# Altium footprint library SparkFun-Retired.PCBLIB: 302 footprints (part 18 of 19)
Each footprint in its own frame and in the unit in brackets; x right, y up, seen from the top. Pads: shape width x height; smd on the part's side, far side on the other; paste and mask are expansions set on the pad; w line width, h text height; cw(c..) or ccw(c..) is an arc to the next point about the centre after c.
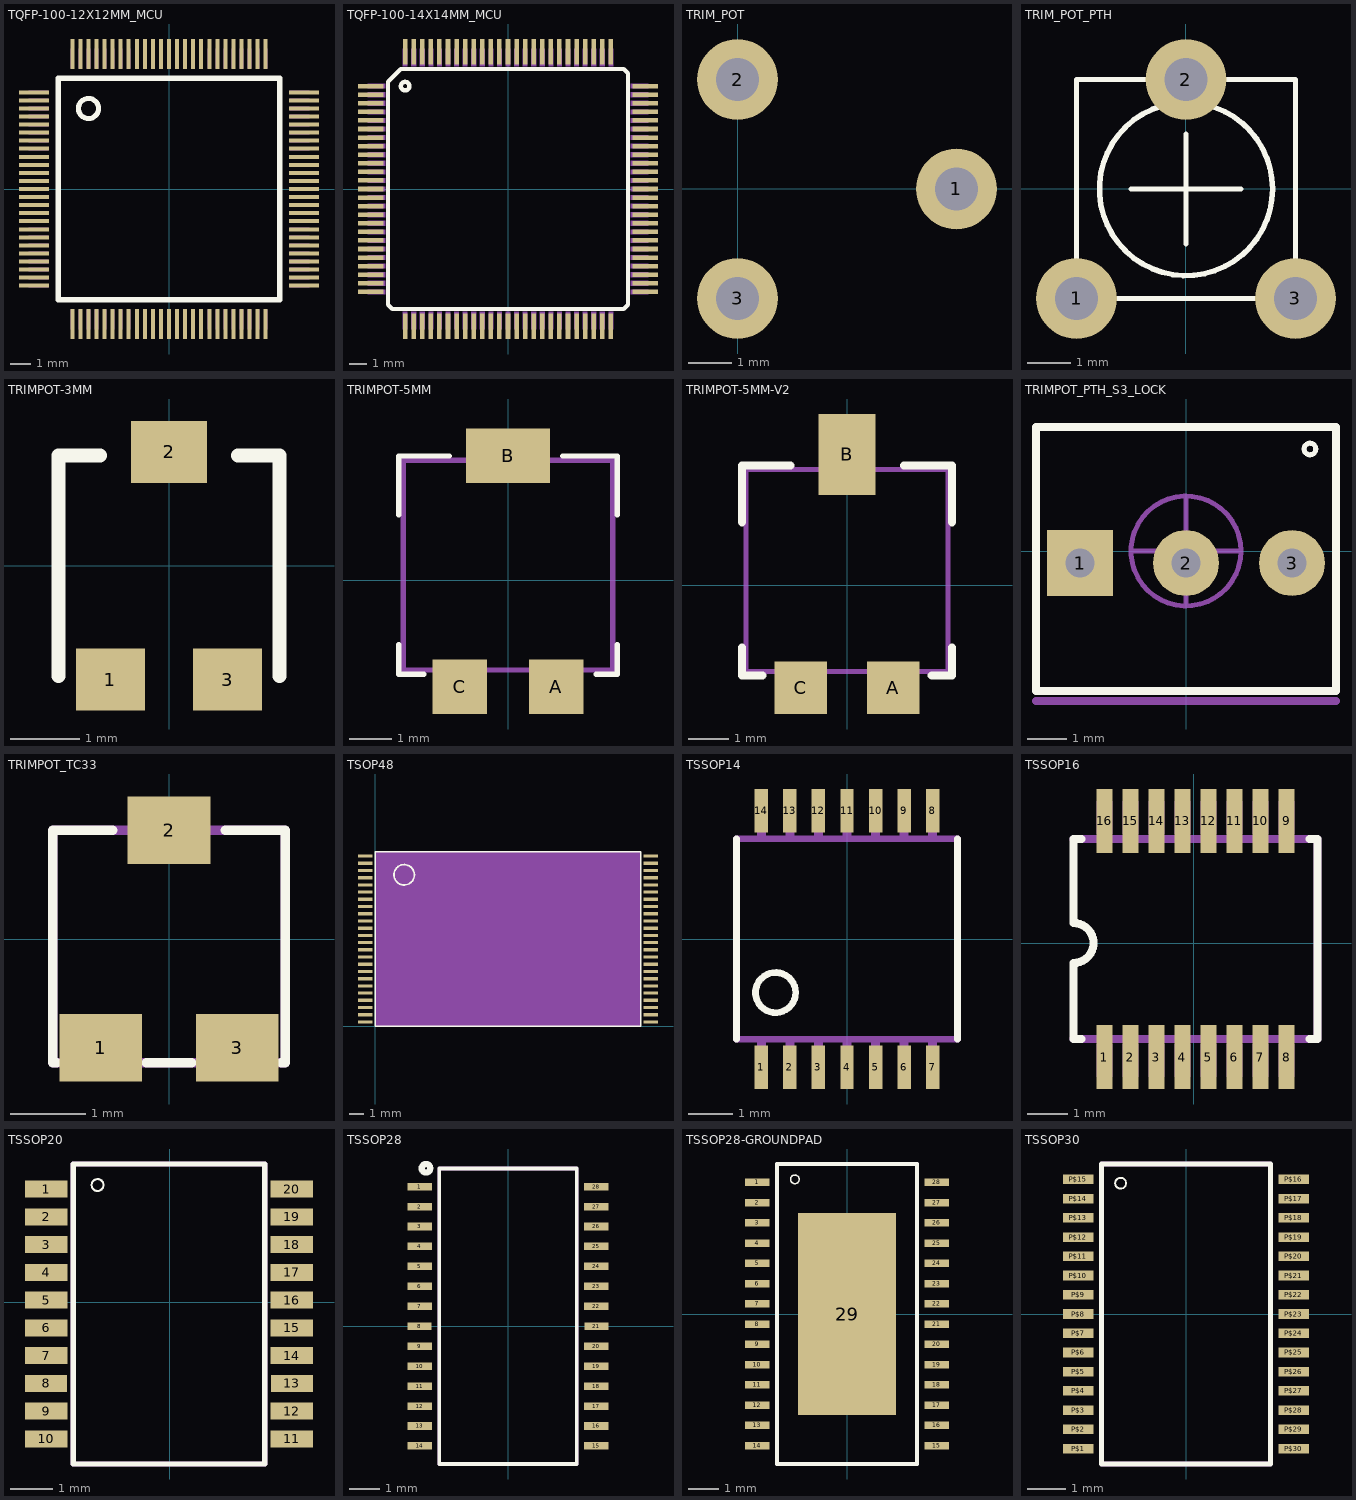
[diagram p17: the footprints below, top view; thin cyan lines are the x and y axes]

## TQFP-100-12X12MM_MCU [mm]
pads (100):
  rect 1.5x0.2 smd: 1(-6.7,4.8) 2(-6.7,4.4) 3(-6.7,4) 4(-6.7,3.6) 5(-6.7,3.2) 6(-6.7,2.8) 7(-6.7,2.4) 8(-6.7,2) 9(-6.7,1.6) 10(-6.7,1.2) 11(-6.7,0.8) 12(-6.7,0.4) 13(-6.7,0) 14(-6.7,-0.4) 15(-6.7,-0.8) 16(-6.7,-1.2) 17(-6.7,-1.6) 18(-6.7,-2) 19(-6.7,-2.4) 20(-6.7,-2.8) 21(-6.7,-3.2) 22(-6.7,-3.6) 23(-6.7,-4) 24(-6.7,-4.4) 25(-6.7,-4.8) 51(6.7,-4.8) 52(6.7,-4.4) 53(6.7,-4) 54(6.7,-3.6) 55(6.7,-3.2) 56(6.7,-2.8) 57(6.7,-2.4) 58(6.7,-2) 59(6.7,-1.6) 60(6.7,-1.2) 61(6.7,-0.8) 62(6.7,-0.4) 63(6.7,0) 64(6.7,0.4) 65(6.7,0.8) 66(6.7,1.2) 67(6.7,1.6) 68(6.7,2) 69(6.7,2.4) 70(6.7,2.8) 71(6.7,3.2) 72(6.7,3.6) 73(6.7,4) 74(6.7,4.4) 75(6.7,4.8)
  rect 0.2x1.5 smd: 26(-4.8,-6.7) 27(-4.4,-6.7) 28(-4,-6.7) 29(-3.6,-6.7) 30(-3.2,-6.7) 31(-2.8,-6.7) 32(-2.4,-6.7) 33(-2,-6.7) 34(-1.6,-6.7) 35(-1.2,-6.7) 36(-0.8,-6.7) 37(-0.4,-6.7) 38(0,-6.7) 39(0.4,-6.7) 40(0.8,-6.7) 41(1.2,-6.7) 42(1.6,-6.7) 43(2,-6.7) 44(2.4,-6.7) 45(2.8,-6.7) 46(3.2,-6.7) 47(3.6,-6.7) 48(4,-6.7) 49(4.4,-6.7) 50(4.8,-6.7) 76(4.8,6.7) 77(4.4,6.7) 78(4,6.7) 79(3.6,6.7) 80(3.2,6.7) 81(2.8,6.7) 82(2.4,6.7) 83(2,6.7) 84(1.6,6.7) 85(1.2,6.7) 86(0.8,6.7) 87(0.4,6.7) 88(0,6.7) 89(-0.4,6.7) 90(-0.8,6.7) 91(-1.2,6.7) 92(-1.6,6.7) 93(-2,6.7) 94(-2.4,6.7) 95(-2.8,6.7) 96(-3.2,6.7) 97(-3.6,6.7) 98(-4,6.7) 99(-4.4,6.7) 100(-4.8,6.7)
Top Overlay:
  circle w0.254: c-4,4 r0.5
  lines w0.254: -5.5,-5.5 -5.5,5.5 5.5,5.5 5.5,-5.5 -5.5,-5.5
Mechanical 16:
  region: -5.99,4.71 -5.99,4.89 -6.99,4.89 -6.99,4.71
  region: -5.99,4.31 -5.99,4.49 -6.99,4.49 -6.99,4.31
  region: -5.99,3.91 -5.99,4.09 -6.99,4.09 -6.99,3.91
  region: -5.99,3.51 -5.99,3.69 -6.99,3.69 -6.99,3.51
  region: -5.99,3.11 -5.99,3.29 -6.99,3.29 -6.99,3.11
  region: -5.99,2.71 -5.99,2.89 -6.99,2.89 -6.99,2.71
  region: -5.99,2.31 -5.99,2.49 -6.99,2.49 -6.99,2.31
  region: -5.99,1.91 -5.99,2.09 -6.99,2.09 -6.99,1.91
  region: -5.99,1.51 -5.99,1.69 -6.99,1.69 -6.99,1.51
  region: -5.99,1.11 -5.99,1.29 -6.99,1.29 -6.99,1.11
  region: -5.99,0.71 -5.99,0.89 -6.99,0.89 -6.99,0.71
  region: -5.99,0.31 -5.99,0.49 -6.99,0.49 -6.99,0.31
  region: -5.99,-0.09 -5.99,0.09 -6.99,0.09 -6.99,-0.09
  region: -5.99,-0.49 -5.99,-0.31 -6.99,-0.31 -6.99,-0.49
  region: -5.99,-0.89 -5.99,-0.71 -6.99,-0.71 -6.99,-0.89
  region: -5.99,-1.29 -5.99,-1.11 -6.99,-1.11 -6.99,-1.29
  region: -5.99,-1.69 -5.99,-1.51 -6.99,-1.51 -6.99,-1.69
  region: -5.99,-2.09 -5.99,-1.91 -6.99,-1.91 -6.99,-2.09
  region: -5.99,-2.49 -5.99,-2.31 -6.99,-2.31 -6.99,-2.49
  region: -5.99,-2.89 -5.99,-2.71 -6.99,-2.71 -6.99,-2.89
  region: -5.99,-3.29 -5.99,-3.11 -6.99,-3.11 -6.99,-3.29
  region: -5.99,-3.69 -5.99,-3.51 -6.99,-3.51 -6.99,-3.69
  region: -5.99,-4.09 -5.99,-3.91 -6.99,-3.91 -6.99,-4.09
  region: -5.99,-4.49 -5.99,-4.31 -6.99,-4.31 -6.99,-4.49
  region: -5.99,-4.89 -5.99,-4.71 -6.99,-4.71 -6.99,-4.89
  region: -4.71,-5.99 -4.89,-5.99 -4.89,-6.99 -4.71,-6.99
  region: -4.31,-5.99 -4.49,-5.99 -4.49,-6.99 -4.31,-6.99
  region: -3.91,-5.99 -4.09,-5.99 -4.09,-6.99 -3.91,-6.99
  region: -3.51,-5.99 -3.69,-5.99 -3.69,-6.99 -3.51,-6.99
  region: -3.11,-5.99 -3.29,-5.99 -3.29,-6.99 -3.11,-6.99
  region: -2.71,-5.99 -2.89,-5.99 -2.89,-6.99 -2.71,-6.99
  region: -2.31,-5.99 -2.49,-5.99 -2.49,-6.99 -2.31,-6.99
  region: -1.91,-5.99 -2.09,-5.99 -2.09,-6.99 -1.91,-6.99
  region: -1.51,-5.99 -1.69,-5.99 -1.69,-6.99 -1.51,-6.99
  region: -1.11,-5.99 -1.29,-5.99 -1.29,-6.99 -1.11,-6.99
  region: -0.71,-5.99 -0.89,-5.99 -0.89,-6.99 -0.71,-6.99
  region: -0.31,-5.99 -0.49,-5.99 -0.49,-6.99 -0.31,-6.99
  region: 0.09,-5.99 -0.09,-5.99 -0.09,-6.99 0.09,-6.99
  region: 0.49,-5.99 0.31,-5.99 0.31,-6.99 0.49,-6.99
  region: 0.89,-5.99 0.71,-5.99 0.71,-6.99 0.89,-6.99
  region: 1.29,-5.99 1.11,-5.99 1.11,-6.99 1.29,-6.99
  region: 1.69,-5.99 1.51,-5.99 1.51,-6.99 1.69,-6.99
  region: 2.09,-5.99 1.91,-5.99 1.91,-6.99 2.09,-6.99
  region: 2.49,-5.99 2.31,-5.99 2.31,-6.99 2.49,-6.99
  region: 2.89,-5.99 2.71,-5.99 2.71,-6.99 2.89,-6.99
  region: 3.29,-5.99 3.11,-5.99 3.11,-6.99 3.29,-6.99
  region: 3.69,-5.99 3.51,-5.99 3.51,-6.99 3.69,-6.99
  region: 4.09,-5.99 3.91,-5.99 3.91,-6.99 4.09,-6.99
  region: 4.09,-5.99 3.91,-5.99 3.91,-6.99 4.09,-6.99
  region: 4.49,-5.99 4.31,-5.99 4.31,-6.99 4.49,-6.99
  region: 4.89,-5.99 4.71,-5.99 4.71,-6.99 4.89,-6.99
  region: 5.99,-4.71 5.99,-4.89 6.99,-4.89 6.99,-4.71
  region: 5.99,-4.31 5.99,-4.49 6.99,-4.49 6.99,-4.31
  region: 5.99,-3.91 5.99,-4.09 6.99,-4.09 6.99,-3.91
  region: 5.99,-3.91 5.99,-4.09 6.99,-4.09 6.99,-3.91
  region: 5.99,-3.51 5.99,-3.69 6.99,-3.69 6.99,-3.51
  region: 5.99,-3.51 5.99,-3.69 6.99,-3.69 6.99,-3.51
  region: 5.99,-3.11 5.99,-3.29 6.99,-3.29 6.99,-3.11
  region: 5.99,-2.71 5.99,-2.89 6.99,-2.89 6.99,-2.71
  region: 5.99,-2.31 5.99,-2.49 6.99,-2.49 6.99,-2.31
  region: 5.99,-1.91 5.99,-2.09 6.99,-2.09 6.99,-1.91
  region: 5.99,-1.51 5.99,-1.69 6.99,-1.69 6.99,-1.51
  region: 5.99,-1.11 5.99,-1.29 6.99,-1.29 6.99,-1.11
  region: 5.99,-0.71 5.99,-0.89 6.99,-0.89 6.99,-0.71
  region: 5.99,-0.31 5.99,-0.49 6.99,-0.49 6.99,-0.31
  region: 5.99,0.09 5.99,-0.09 6.99,-0.09 6.99,0.09
  region: 5.99,0.49 5.99,0.31 6.99,0.31 6.99,0.49
  region: 5.99,0.89 5.99,0.71 6.99,0.71 6.99,0.89
  region: 5.99,1.29 5.99,1.11 6.99,1.11 6.99,1.29
  region: 5.99,1.69 5.99,1.51 6.99,1.51 6.99,1.69
  region: 5.99,2.09 5.99,1.91 6.99,1.91 6.99,2.09
  region: 5.99,2.49 5.99,2.31 6.99,2.31 6.99,2.49
  region: 5.99,2.89 5.99,2.71 6.99,2.71 6.99,2.89
  region: 5.99,3.29 5.99,3.11 6.99,3.11 6.99,3.29
  region: 5.99,3.69 5.99,3.51 6.99,3.51 6.99,3.69
  region: 5.99,4.09 5.99,3.91 6.99,3.91 6.99,4.09
  region: 5.99,4.49 5.99,4.31 6.99,4.31 6.99,4.49
  region: 5.99,4.89 5.99,4.71 6.99,4.71 6.99,4.89
  rectangle: 4.71,5.99 4.89,6.99
  rectangle: 4.31,5.99 4.49,6.99
  rectangle: 3.91,5.99 4.09,6.99
  rectangle: 3.51,5.99 3.69,6.99
  rectangle: 3.11,5.99 3.29,6.99
  rectangle: 2.71,5.99 2.89,6.99
  rectangle: 2.31,5.99 2.49,6.99
  rectangle: 1.91,5.99 2.09,6.99
  rectangle: 1.51,5.99 1.69,6.99
  rectangle: 1.11,5.99 1.29,6.99
  rectangle: 0.71,5.99 0.89,6.99
  rectangle: 0.31,5.99 0.49,6.99
  rectangle: -0.09,5.99 0.09,6.99
  rectangle: -0.49,5.99 -0.31,6.99
  rectangle: -0.89,5.99 -0.71,6.99
  rectangle: -1.29,5.99 -1.11,6.99
  rectangle: -1.69,5.99 -1.51,6.99
  rectangle: -2.09,5.99 -1.91,6.99
  rectangle: -2.09,5.99 -1.91,6.99
  rectangle: -2.49,5.99 -2.31,6.99
  rectangle: -2.89,5.99 -2.71,6.99
  rectangle: -3.29,5.99 -3.11,6.99
  rectangle: -3.69,5.99 -3.51,6.99
  rectangle: -4.09,5.99 -3.91,6.99
  rectangle: -4.49,5.99 -4.31,6.99
  rectangle: -4.89,5.99 -4.71,6.99

## TQFP-100-14X14MM_MCU [mm]
pads (100):
  rect 1.5x0.27 smd: 1(-8,6) 2(-8,5.5) 3(-8,5) 4(-8,4.5) 5(-8,4) 6(-8,3.5) 7(-8,3) 8(-8,2.5) 9(-8,2) 10(-8,1.5) 11(-8,1) 12(-8,0.5) 13(-8,0) 14(-8,-0.5) 15(-8,-1) 16(-8,-1.5) 17(-8,-2) 18(-8,-2.5) 19(-8,-3) 20(-8,-3.5) 21(-8,-4) 22(-8,-4.5) 23(-8,-5) 24(-8,-5.5) 25(-8,-6) 51(8,-6) 52(8,-5.5) 53(8,-5) 54(8,-4.5) 55(8,-4) 56(8,-3.5) 57(8,-3) 58(8,-2.5) 59(8,-2) 60(8,-1.5) 61(8,-1) 62(8,-0.5) 63(8,0) 64(8,0.5) 65(8,1) 66(8,1.5) 67(8,2) 68(8,2.5) 69(8,3) 70(8,3.5) 71(8,4) 72(8,4.5) 73(8,5) 74(8,5.5) 75(8,6)
  rect 0.27x1.5 smd: 26(-6,-8) 27(-5.5,-8) 28(-5,-8) 29(-4.5,-8) 30(-4,-8) 31(-3.5,-8) 32(-3,-8) 33(-2.5,-8) 34(-2,-8) 35(-1.5,-8) 36(-1,-8) 37(-0.5,-8) 38(0,-8) 39(0.5,-8) 40(1,-8) 41(1.5,-8) 42(2,-8) 43(2.5,-8) 44(3,-8) 45(3.5,-8) 46(4,-8) 47(4.5,-8) 48(5,-8) 49(5.5,-8) 50(6,-8) 76(6,8) 77(5.5,8) 78(5,8) 79(4.5,8) 80(4,8) 81(3.5,8) 82(3,8) 83(2.5,8) 84(2,8) 85(1.5,8) 86(1,8) 87(0.5,8) 88(0,8) 89(-0.5,8) 90(-1,8) 91(-1.5,8) 92(-2,8) 93(-2.5,8) 94(-3,8) 95(-3.5,8) 96(-4,8) 97(-4.5,8) 98(-5,8) 99(-5.5,8) 100(-6,8)
Top Overlay:
  circle w0.254: c-6,6 r0.25
  lines w0.254: -7,-6.75 -6.75,-7 6.75,-7 7,-6.75 7,6.75 6.75,7 -6.25,7 -7,6.25 -7,-6.75
Mechanical 16:
  rectangle: -8.2,5.85 -7.15,6.15
  rectangle: -8.2,5.35 -7.15,5.65
  rectangle: -8.2,4.85 -7.15,5.15
  rectangle: -8.2,4.35 -7.15,4.65
  rectangle: -8.2,3.85 -7.15,4.15
  rectangle: -8.2,3.35 -7.15,3.65
  rectangle: -8.2,2.85 -7.15,3.15
  rectangle: -8.2,2.35 -7.15,2.65
  rectangle: -8.2,1.85 -7.15,2.15
  rectangle: -8.2,1.35 -7.15,1.65
  rectangle: -8.2,0.85 -7.15,1.15
  rectangle: -8.2,0.35 -7.15,0.65
  rectangle: -8.2,-0.15 -7.15,0.15
  rectangle: -8.2,-0.65 -7.15,-0.35
  rectangle: -8.2,-1.15 -7.15,-0.85
  rectangle: -8.2,-1.65 -7.15,-1.35
  rectangle: -8.2,-2.15 -7.15,-1.85
  rectangle: -8.2,-2.65 -7.15,-2.35
  rectangle: -8.2,-3.15 -7.15,-2.85
  rectangle: -8.2,-3.65 -7.15,-3.35
  rectangle: -8.2,-4.15 -7.15,-3.85
  rectangle: -8.2,-4.65 -7.15,-4.35
  rectangle: -8.2,-5.15 -7.15,-4.85
  rectangle: -8.2,-5.65 -7.15,-5.35
  rectangle: -8.2,-6.15 -7.15,-5.85
  rectangle: -6.15,-8.2 -5.85,-7.15
  rectangle: -5.65,-8.2 -5.35,-7.15
  rectangle: -5.15,-8.2 -4.85,-7.15
  rectangle: -4.65,-8.2 -4.35,-7.15
  rectangle: -4.15,-8.2 -3.85,-7.15
  rectangle: -3.65,-8.2 -3.35,-7.15
  rectangle: -3.15,-8.2 -2.85,-7.15
  rectangle: -2.65,-8.2 -2.35,-7.15
  rectangle: -2.15,-8.2 -1.85,-7.15
  rectangle: -1.65,-8.2 -1.35,-7.15
  rectangle: -1.15,-8.2 -0.85,-7.15
  rectangle: -0.65,-8.2 -0.35,-7.15
  rectangle: -0.15,-8.2 0.15,-7.15
  rectangle: 0.35,-8.2 0.65,-7.15
  rectangle: 0.85,-8.2 1.15,-7.15
  rectangle: 1.35,-8.2 1.65,-7.15
  rectangle: 1.85,-8.2 2.15,-7.15
  rectangle: 2.35,-8.2 2.65,-7.15
  rectangle: 2.85,-8.2 3.15,-7.15
  rectangle: 3.35,-8.2 3.65,-7.15
  rectangle: 3.85,-8.2 4.15,-7.15
  rectangle: 4.35,-8.2 4.65,-7.15
  rectangle: 4.85,-8.2 5.15,-7.15
  rectangle: 5.35,-8.2 5.65,-7.15
  rectangle: 5.85,-8.2 6.15,-7.15
  rectangle: 7.15,-6.15 8.2,-5.85
  rectangle: 7.15,-5.65 8.2,-5.35
  rectangle: 7.15,-5.15 8.2,-4.85
  rectangle: 7.15,-4.65 8.2,-4.35
  rectangle: 7.15,-4.15 8.2,-3.85
  rectangle: 7.15,-3.65 8.2,-3.35
  rectangle: 7.15,-3.15 8.2,-2.85
  rectangle: 7.15,-2.65 8.2,-2.35
  rectangle: 7.15,-2.15 8.2,-1.85
  rectangle: 7.15,-1.65 8.2,-1.35
  rectangle: 7.15,-1.15 8.2,-0.85
  rectangle: 7.15,-0.65 8.2,-0.35
  rectangle: 7.15,-0.15 8.2,0.15
  rectangle: 7.15,0.35 8.2,0.65
  rectangle: 7.15,0.85 8.2,1.15
  rectangle: 7.15,1.35 8.2,1.65
  rectangle: 7.15,1.85 8.2,2.15
  rectangle: 7.15,2.35 8.2,2.65
  rectangle: 7.15,2.85 8.2,3.15
  rectangle: 7.15,3.35 8.2,3.65
  rectangle: 7.15,3.85 8.2,4.15
  rectangle: 7.15,4.35 8.2,4.65
  rectangle: 7.15,4.85 8.2,5.15
  rectangle: 7.15,5.35 8.2,5.65
  rectangle: 7.15,5.85 8.2,6.15
  rectangle: 5.85,7.15 6.15,8.2
  rectangle: 5.35,7.15 5.65,8.2
  rectangle: 4.85,7.15 5.15,8.2
  rectangle: 4.35,7.15 4.65,8.2
  rectangle: 3.85,7.15 4.15,8.2
  rectangle: 3.35,7.15 3.65,8.2
  rectangle: 2.85,7.15 3.15,8.2
  rectangle: 2.35,7.15 2.65,8.2
  rectangle: 1.85,7.15 2.15,8.2
  rectangle: 1.35,7.15 1.65,8.2
  rectangle: 0.85,7.15 1.15,8.2
  rectangle: 0.35,7.15 0.65,8.2
  rectangle: -0.15,7.15 0.15,8.2
  rectangle: -0.65,7.15 -0.35,8.2
  rectangle: -1.15,7.15 -0.85,8.2
  rectangle: -1.65,7.15 -1.35,8.2
  rectangle: -2.15,7.15 -1.85,8.2
  rectangle: -2.65,7.15 -2.35,8.2
  rectangle: -3.15,7.15 -2.85,8.2
  rectangle: -3.65,7.15 -3.35,8.2
  rectangle: -4.15,7.15 -3.85,8.2
  rectangle: -4.65,7.15 -4.35,8.2
  rectangle: -5.15,7.15 -4.85,8.2
  rectangle: -5.65,7.15 -5.35,8.2
  rectangle: -6.15,7.15 -5.85,8.2

## TRIM_POT [mil]
pads (3):
  round 74 hole 39.37: 1(200,0) 2(0,100) 3(0,-100)

## TRIM_POT_PTH [mil]
pads (3):
  round 74 hole 39.37: 1(-100,-100) 2(0,100) 3(100,-100)
Top Overlay:
  circle w5: c0,0 r79.06
  lines w5: -50,0 0,0 ; 0,-50 0,0 ; 0,50 0,0 ; 50,0 0,0 ; -100,-100 -100,100 100,100 100,-100 -100,-100

## TRIMPOT-3MM [mm]
pads (3):
  rect 1x0.9 smd: 1(-0.85,-1.65) 3(0.85,-1.65)
  rect 1.1x0.9 smd: 2(0,1.65)
Top Overlay:
  lines w0.203: -1.6,-1.6 -1.6,1.6 -1,1.6 ; 1,1.6 1.6,1.6 1.6,-1.6

## TRIMPOT-5MM [mm]
pads (3):
  rect 1.3x1.3 smd: A(1.15,-2.54) C(-1.15,-2.54)
  rect 2x1.3 smd: B(0,2.96)
Top Overlay:
  lines w0.127: -2.6,-1.54 -2.6,-2.24 -2,-2.24 ; -2.6,1.56 -2.6,2.96 -1.4,2.96 ; 1.3,2.96 2.6,2.96 2.6,1.56 ; 2.1,-2.24 2.6,-2.24 2.6,-1.54
Mechanical 16:
  lines w0.127: -2.5,-2.14 0,-2.14 2.5,-2.14 2.5,2.86 -2.5,2.86 -2.5,-2.14

## TRIMPOT-5MM-V2 [mil]
pads (3):
  rect 51.18x51.18 smd: A(45.28,-100) C(-45.28,-100)
  rect 55.18x78.74 smd: B(0,127.5)
Top Overlay:
  lines w8: -102.36,-60.63 -102.36,-88.19 -82.44,-88.19 ; -102.36,61.42 -102.36,116.54 -55.12,116.54 ; 55.48,116.54 102.36,116.54 102.36,61.42 ; 82.68,-88.19 102.36,-88.19 102.36,-60.63
Mechanical 16:
  lines w5: -98.43,-84.25 -98.43,112.6 98.43,112.6 98.43,-84.25 -98.43,-84.25

## TRIMPOT_PTH_S3_LOCK [mil]
pads (3):
  rect 66x66 hole 29: 1(-106,-12)
  round 66 hole 29: 2(0,-12) 3(106,-12)
Top Overlay:
  circle w5: c124,102 r5.83
  lines w8: -150,-140 150,-140 150,124 -150,124 -150,-140
Mechanical 16:
  circle w5: c0,0 r55
  circle w1: c-100,-11 r9
  circle w1: c0,-11 r9
  circle w1: c100,-11 r9
  lines w5: -55,0 55,0 ; 0,-55 0,55
  lines w8: -150,-150 150,-150

## TRIMPOT_TC33 [mil]
pads (3):
  rect 43.31x35.43 smd: 1(-35.83,-57.09) 2(0,57.09) 3(35.83,-57.09)
Top Overlay:
  lines w5: -59.06,-64.96 -61.02,-64.96 -61.02,57.09 -29.53,57.09 ; -11.81,-64.96 11.81,-64.96 ; 29.53,57.09 61.02,57.09 61.02,-64.96 59.06,-64.96
Mechanical 16:
  lines w5: -61.02,-64.96 61.02,-64.96 61.02,57.09 -61.02,57.09 -61.02,-64.96

## TSOP48 [mm]
pads (48):
  rect 1x0.22 smd: 1(-0.7,11.8) 2(-0.7,11.3) 3(-0.7,10.8) 4(-0.7,10.3) 5(-0.7,9.8) 6(-0.7,9.3) 7(-0.7,8.8) 8(-0.7,8.3) 9(-0.7,7.8) 10(-0.7,7.3) 11(-0.7,6.8) 12(-0.7,6.3) 13(-0.7,5.8) 14(-0.7,5.3) 15(-0.7,4.8) 16(-0.7,4.3) 17(-0.7,3.8) 18(-0.7,3.3) 19(-0.7,2.8) 20(-0.7,2.3) 21(-0.7,1.8) 22(-0.7,1.3) 23(-0.7,0.8) 24(-0.7,0.3) 25(19.1,0.3) 26(19.1,0.8) 27(19.1,1.3) 28(19.1,1.8) 29(19.1,2.3) 30(19.1,2.8) 31(19.1,3.3) 32(19.1,3.8) 33(19.1,4.3) 34(19.1,4.8) 35(19.1,5.3) 36(19.1,5.8) 37(19.1,6.3) 38(19.1,6.8) 39(19.1,7.3) 40(19.1,7.8) 41(19.1,8.3) 42(19.1,8.8) 43(19.1,9.3) 44(19.1,9.8) 45(19.1,10.3) 46(19.1,10.8) 47(19.1,11.3) 48(19.1,11.8)
Top Overlay:
  circle w0.127: c2,10.5 r0.707
  lines w0.127: 0,0 18.4,0 18.4,12.1 0,12.1 0,0
Mechanical 16:
  rectangle: 0,0 18.4,12.1

## TSSOP14 [mil]
pads (14):
  rect 12x39 smd: 1(-76.77,-114.87) 2(-51.18,-114.87) 3(-25.59,-114.87) 4(0,-114.87) 5(25.59,-114.87) 6(51.18,-114.87) 7(76.77,-114.87) 8(76.77,114.87) 9(51.18,114.87) 10(25.59,114.87) 11(0,114.87) 12(-25.59,114.87) 13(-51.18,114.87) 14(-76.77,114.87)
Top Overlay:
  circle w6: c-64,-48 r18
  lines w6: -99,-89.87 -99,89.87 ; 99,-89.87 99,89.87
Mechanical 16:
  rectangle: -80.77,-122.87 -72.77,-89.87
  rectangle: -55.18,-122.87 -47.18,-89.87
  rectangle: -29.59,-122.87 -21.59,-89.87
  rectangle: -4,-122.87 4,-89.87
  rectangle: 21.59,-122.87 29.59,-89.87
  rectangle: 47.18,-122.87 55.18,-89.87
  rectangle: 72.77,-122.87 80.77,-89.87
  rectangle: 72.77,89.87 80.77,122.87
  rectangle: 47.18,89.87 55.18,122.87
  rectangle: 21.59,89.87 29.59,122.87
  rectangle: -4,89.87 4,122.87
  rectangle: -29.59,89.87 -21.59,122.87
  rectangle: -55.18,89.87 -47.18,122.87
  rectangle: -80.77,89.87 -72.77,122.87
  lines w6: -99,-89.87 99,-89.87 ; -99,89.87 99,89.87

## TSSOP16 [mil]
pads (16):
  rect 15.75x62.99 smd: 1(-87.6,-112.2) 2(-62.01,-112.2) 3(-36.42,-112.2) 4(-10.83,-112.2) 5(14.76,-112.2) 6(40.35,-112.2) 7(65.94,-112.2) 8(91.54,-112.2) 9(91.54,120.08) 10(65.94,120.08) 11(40.35,120.08) 12(14.76,120.08) 13(-10.83,120.08) 14(-36.42,120.08) 15(-62.01,120.08) 16(-87.6,120.08)
Top Overlay:
  lines w8: -110.24,-94.49 -118.11,-94.49 -118.11,-19.69 ccw(c-118.11,0) -118.11,19.69 -118.11,102.36 -110.24,102.36 ; 114.17,-94.49 122.05,-94.49 122.05,102.36 114.17,102.36
Mechanical 16:
  rectangle: -95.47,-131.89 -79.72,-99.6
  rectangle: -69.88,-131.89 -54.13,-99.6
  rectangle: -44.29,-131.89 -28.54,-99.6
  rectangle: -18.7,-131.89 -2.95,-99.6
  rectangle: 6.89,-131.89 22.64,-99.6
  rectangle: 32.48,-131.89 48.23,-99.6
  rectangle: 58.07,-131.89 73.82,-99.6
  rectangle: 83.66,-131.89 99.41,-99.6
  rectangle: 83.66,107.48 99.41,139.77
  rectangle: 58.07,107.48 73.82,139.77
  rectangle: 32.48,107.48 48.23,139.77
  rectangle: 6.89,107.48 22.64,139.77
  rectangle: -18.7,107.48 -2.95,139.77
  rectangle: -44.29,107.48 -28.54,139.77
  rectangle: -69.88,107.48 -54.13,139.77
  rectangle: -95.47,107.48 -79.72,139.77
  rectangle: -95.47,-131.89 -79.72,-99.6
  rectangle: -69.88,-131.89 -54.13,-99.6
  rectangle: -44.29,-131.89 -28.54,-99.6
  rectangle: -18.7,-131.89 -2.95,-99.6
  rectangle: 6.89,-131.89 22.64,-99.6
  rectangle: 32.48,-131.89 48.23,-99.6
  rectangle: 58.07,-131.89 73.82,-99.6
  rectangle: 83.66,-131.89 99.41,-99.6
  rectangle: 83.66,107.48 99.41,139.77
  rectangle: 58.07,107.48 73.82,139.77
  rectangle: 32.48,107.48 48.23,139.77
  rectangle: 6.89,107.48 22.64,139.77
  rectangle: -18.7,107.48 -2.95,139.77
  rectangle: -44.29,107.48 -28.54,139.77
  rectangle: -69.88,107.48 -54.13,139.77
  rectangle: -95.47,107.48 -79.72,139.77
  lines w8: -118.11,-94.49 122.05,-94.49 122.05,102.36 -118.11,102.36

## TSSOP20 [mm]
pads (20):
  rect 1x0.4 smd: 1(-2.937,2.693) 2(-2.937,2.033) 3(-2.937,1.372) 4(-2.937,0.712) 5(-2.937,0.051) 6(-2.937,-0.609) 7(-2.937,-1.269) 8(-2.943,-1.93) 9(-2.937,-2.59) 10(-2.937,-3.251) 11(2.905,-3.251) 12(2.905,-2.59) 13(2.911,-1.93) 14(2.905,-1.269) 15(2.905,-0.609) 16(2.905,0.051) 17(2.905,0.712) 18(2.905,1.372) 19(2.905,2.033) 20(2.905,2.693)
Top Overlay:
  circle w0.05: c-1.716,2.791 r0.141
  lines w0.127: -2.292,-3.849 2.26,-3.849 2.26,3.291 -2.292,3.291 -2.292,-3.849
Mechanical 16:
  lines w0.127: -2.292,-3.849 2.26,-3.849 2.26,3.291 -2.292,3.291 -2.292,-3.849

## TSSOP28 [mil]
pads (28):
  rect 31.5x9.84 smd: 1(-115,182) 2(-115,156) 3(-115,130) 4(-115,104) 5(-115,78) 6(-115,52) 7(-115,26) 8(-115.24,0) 9(-115,-26) 10(-115,-52) 11(-115,-78) 12(-115,-104) 13(-115,-130) 14(-115,-156) 15(115,-156) 16(115,-130) 17(115,-104) 18(115,-78) 19(115,-52) 20(115,-26) 21(115.24,0) 22(115,26) 23(115,52) 24(115,78) 25(115,104) 26(115,130) 27(115,156) 28(115,182)
Top Overlay:
  circle w8: c-106.93,205.86 r5.57
  lines w5: -89.61,-179.54 89.61,-179.54 89.61,205.54 -89.61,205.54 -89.61,-179.54
Mechanical 16:
  lines w5: -89.61,-179.54 89.61,-179.54 89.61,205.54 -89.61,205.54 -89.61,-179.54

## TSSOP28-GROUNDPAD [mil]
pads (29):
  rect 31.5x9.84 smd: 1(-115,169.2) 2(-115,143.2) 3(-115,117.2) 4(-115,91.2) 5(-115,65.2) 6(-115,39.2) 7(-115,13.2) 8(-115.24,-12.8) 9(-115,-38.8) 10(-115,-64.8) 11(-115,-90.8) 12(-115,-116.8) 13(-115,-142.8) 14(-115,-168.8) 15(115,-168.8) 16(115,-142.8) 17(115,-116.8) 18(115,-90.8) 19(115,-64.8) 20(115,-38.8) 21(115.24,-12.8) 22(115,13.2) 23(115,39.2) 24(115,65.2) 25(115,91.2) 26(115,117.2) 27(115,143.2) 28(115,169.2)
  rect 125.98x259.84 smd: 29(0,0.2)
Top Overlay:
  circle w1.97: c-66.93,173.06 r5.57
  lines w5: -89.61,-192.34 89.61,-192.34 89.61,192.75 -89.61,192.75 -89.61,-192.34
Top Paste:
  region: 0,0 10,0 10,10 0,10
Mechanical 16:
  lines w5: -89.61,-192.34 89.61,-192.34 89.61,192.75 -89.61,192.75 -89.61,-192.34

## TSSOP30 [mil]
pads (30):
  rect 31.5x9.84 smd: P$1(-110.24,-137.8) P$2(-110.24,-118.11) P$3(-110.24,-98.43) P$4(-110.24,-78.74) P$5(-110.24,-59.06) P$6(-110.24,-39.37) P$7(-110.24,-19.69) P$8(-110.24,0) P$9(-110.24,19.69) P$10(-110.24,39.37) P$11(-110.24,59.06) P$12(-110.24,78.74) P$13(-110.24,98.43) P$14(-110.24,118.11) P$15(-110.24,137.8) P$16(110.24,137.8) P$17(110.24,118.11) P$18(110.24,98.43) P$19(110.24,78.74) P$20(110.24,59.06) P$21(110.24,39.37) P$22(110.24,19.69) P$23(110.24,0) P$24(110.24,-19.69) P$25(110.24,-39.37) P$26(110.24,-59.06) P$27(110.24,-78.74) P$28(110.24,-98.43) P$29(110.24,-118.11) P$30(110.24,-137.8)
Top Overlay:
  circle w1.97: c-66.93,133.86 r5.57
  lines w5: -86.61,-153.54 86.61,-153.54 86.61,153.54 -86.61,153.54 -86.61,-153.54
Mechanical 16:
  lines w5: -86.61,-153.54 86.61,-153.54 86.61,153.54 -86.61,153.54 -86.61,-153.54